# Altium footprint library WARG.PcbLib: 73 footprints (part 4 of 5)
Each footprint in its own frame and in the unit in brackets; x right, y up, seen from the top. Pads: shape width x height; smd on the part's side, far side on the other; paste and mask are expansions set on the pad; w line width, h text height; cw(c..) or ccw(c..) is an arc to the next point about the centre after c.
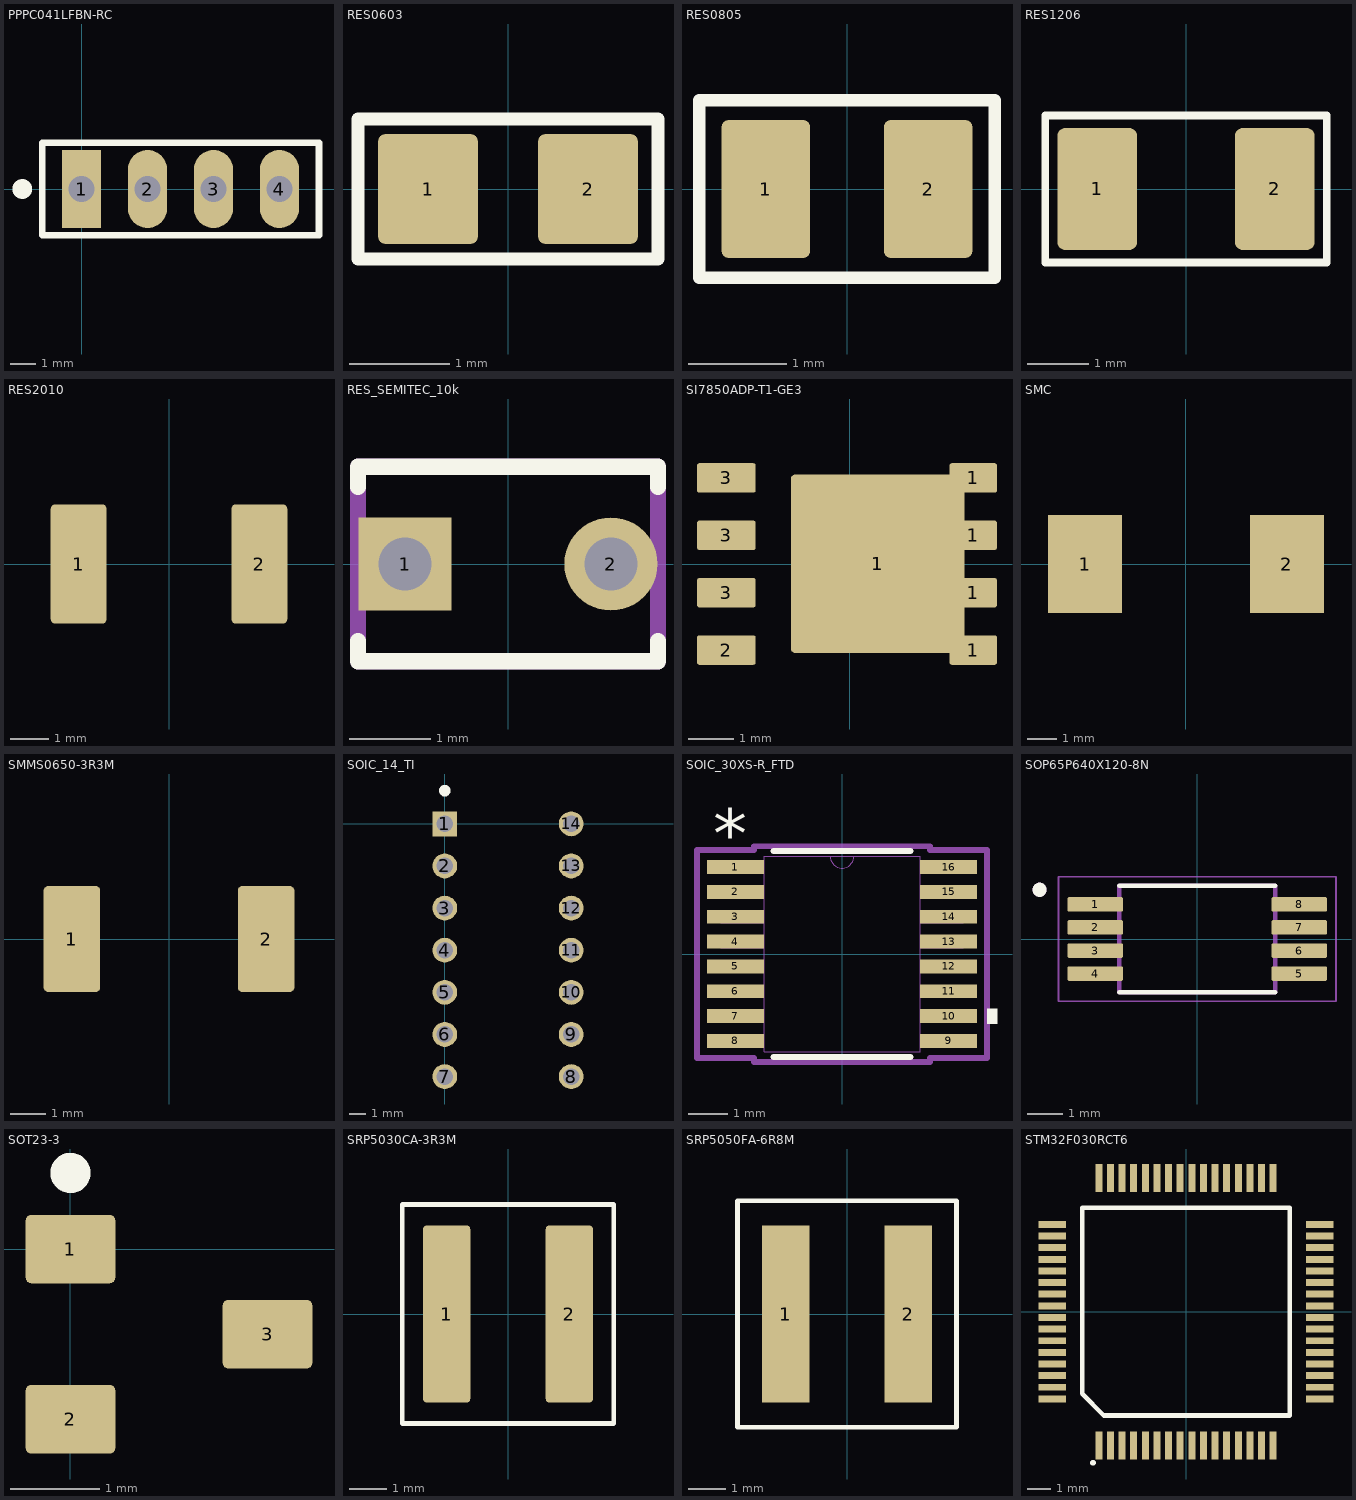
[diagram p3: the footprints below, top view; thin cyan lines are the x and y axes]

## PPPC041LFBN-RC [mm] "4 Pin Female Header"
pads (4):
  rect 1.508x3.016 hole 1: 1(0,0)
  oval 1.508x3.016 hole 1: 2(2.54,0) 3(5.08,0) 4(7.62,0)
Top Overlay:
  circle w0.508: c-2.286,0 r0.127
  lines w0.254: -1.524,-1.778 -1.524,1.778 9.144,1.778 9.144,-1.778 -1.524,-1.778
3D body "PPPC041LFBN-RC.stp": height 8.53, standoff -3.47, extent -1.52,-1.27 9.14,1.27

## RES0603 [mm] "SMT Resistor 0603"
height 0.6
pads (2):
  rrect15% 1x1.1 smd: 1(-0.8,0) 2(0.8,0)
Top Overlay:
  lines w0.127: -1.5,-0.7 -1.5,0.7 1.5,0.7 1.5,-0.7 -1.5,-0.7
3D body "0603.step": height 0.46, standoff 0.01, extent -0.8,-0.4 0.8,0.4

## RES0805 [mm] "SMT Resistor 0805"
height 0.5
pads (2):
  rrect15% 0.9x1.4 smd: 1(-0.825,0) 2(0.825,0)
Top Overlay:
  lines w0.127: -1.5,-0.9 -1.5,0.9 1.5,0.9 1.5,-0.9 -1.5,-0.9
3D body "0805 resistor.step": height 0.61, standoff 0.01, extent -1,-0.625 1,0.625

## RES1206 [mm] "SMT Resistor 1206"
height 0.75
pads (2):
  rrect20% 1.3x2 smd: 1(-1.45,0) 2(1.45,0)
Top Overlay:
  lines w0.127: -2.3,-1.2 2.3,-1.2 2.3,1.2 -2.3,1.2 -2.3,-1.2
3D body "1206 resistor.step": height 0.61, standoff 0.01, extent -1.6,-0.8 1.6,0.8

## RES2010 [mm]
pads (2):
  rrect15% 1.45x3.1 smd: 1(-2.35,0) 2(2.35,0)
3D body "PE2010FKE070R01L.STEP": height 0.9, standoff 0.01, extent -2.54,-1.27 2.54,1.27

## RES_SEMITEC_10k [mm]
pads (2):
  rect 1.15x1.15 hole 0.65 paste-1000 mask+0: 1(-1.27,0)
  round 1.15 hole 0.65 paste-1000 mask+0: 2(1.27,0)
Top Overlay:
  lines w0.2: -1.85,-0.95 -1.85,-1.2 1.85,-1.2 1.85,-0.95 ; -1.85,0.95 -1.85,1.2 1.85,1.2 1.85,0.95
Mechanical 12:
  lines w0.2: -1.85,-1.2 1.85,-1.2 1.85,1.2 -1.85,1.2 -1.85,-1.2
3D body "Res_Semitec_103AT-2_eec.STEP": height 0.25, standoff 0, extent -1.95,-1.3 1.95,1.3

## SI7850ADP-T1-GE3 [mm]
pads (9):
  rrect5% 3.85x3.95 smd: 1(0.618,0.005)
  rrect15% 1.05x0.65 smd: 1(2.733,-1.905) 1(2.733,-0.635) 1(2.733,0.635) 1(2.733,1.905)
  rrect15% 1.3x0.65 smd: 2(-2.732,-1.905) 3(-2.732,-0.635) 3(-2.732,0.635) 3(-2.732,1.905)

## SMC [mm]
pads (2):
  rect 2.5x3.3 smd: 1(-3.4,0) 2(3.4,0)
3D body "S3J-13-F.stp": height 2.5, standoff 0, extent -3.97,-2.953 3.97,2.953

## SMMS0650-3R3M [mm] "IND 3.3UH 8.5A 22M OHM"
pads (2):
  rrect15% 1.6x3 smd: 1(-2.75,0) 2(2.75,0)
3D body: height 5, standoff 0, extent -3.55,-3.3 3.55,3.3

## SOIC_14_TI [mil]
pads (14):
  rect 59x59 hole 39 mask+0: 1(0,0)
  round 59 hole 39 mask+0: 2(0,-100) 3(0,-200) 4(0,-300) 5(0,-400) 6(0,-500) 7(0,-600) 8(300,-600) 9(300,-500) 10(300,-400) 11(300,-300) 12(300,-200) 13(300,-100) 14(300,0)
Top Overlay:
  circle w19.68: c0,78.74 r3.94
3D body "PDIP14_300MC_MCH.step": height 215.12, standoff -100, extent -5,-687.48 315,87.48

## SOIC_30XS-R_FTD [mil]
pads (16):
  rect 57.5x14 smd paste+0 mask+0: 1(-107.25,87.5) 2(-107.25,62.5) 3(-107.25,37.5) 4(-107.25,12.5) 5(-107.25,-12.5) 6(-107.25,-37.5) 7(-107.25,-62.5) 8(-107.25,-87.5) 9(107.25,-87.5) 10(107.25,-62.5) 11(107.25,-37.5) 12(107.25,-12.5) 13(107.25,12.5) 14(107.25,37.5) 15(107.25,62.5) 16(107.25,87.5)
Top Overlay:
  region: 146,-55 156,-55 156,-70 146,-70
  lines w6: -68.98,-103.5 68.98,-103.5 ; -68.98,103.5 68.98,103.5
  text "*" at -129.75,96.5 h50
Mechanical 13:
  lines w0: -12,98.5 ccw(c0,98.5) 12,98.5
  lines w1: -122,-93.5 -78.5,-93.5 -78.5,-81.5 -122,-81.5 -122,-93.5 ; -122,-68.5 -78.5,-68.5 -78.5,-56.5 -122,-56.5 -122,-68.5 ; -122,-43.5 -78.5,-43.5 -78.5,-31.5 -122,-31.5 -122,-43.5 ; -122,-18.5 -78.5,-18.5 -78.5,-6.5 -122,-6.5 -122,-18.5 ; -122,6.5 -78.5,6.5 -78.5,18.5 -122,18.5 -122,6.5 ; -122,31.5 -78.5,31.5 -78.5,43.5 -122,43.5 -122,31.5 ; -122,56.5 -78.5,56.5 -78.5,68.5 -122,68.5 -122,56.5 ; -122,81.5 -78.5,81.5 -78.5,93.5 -122,93.5 -122,81.5 ; -78.5,-98.5 -78.5,98.5 78.5,98.5 78.5,-98.5 -78.5,-98.5 ; 78.5,-93.5 122,-93.5 122,-81.5 78.5,-81.5 78.5,-93.5 ; 78.5,-68.5 122,-68.5 122,-56.5 78.5,-56.5 78.5,-68.5 ; 78.5,-43.5 122,-43.5 122,-31.5 78.5,-31.5 78.5,-43.5 ; 78.5,-18.5 122,-18.5 122,-6.5 78.5,-6.5 78.5,-18.5 ; 78.5,6.5 122,6.5 122,18.5 78.5,18.5 78.5,6.5 ; 78.5,31.5 122,31.5 122,43.5 78.5,43.5 78.5,31.5 ; 78.5,56.5 122,56.5 122,68.5 78.5,68.5 78.5,56.5 ; 78.5,81.5 122,81.5 122,93.5 78.5,93.5 78.5,81.5
  text "*" at -76,45.5 h50
Mechanical 15:
  lines w6: -146,-104.5 -88.5,-104.5 -88.5,-108.5 88.5,-108.5 88.5,-104.5 146,-104.5 146,104.5 88.5,104.5 88.5,108.5 -88.5,108.5 -88.5,104.5 -146,104.5 -146,-104.5
3D body "SOIC_30XS-R_FTD.step": height 69.09, standoff 0, extent -122.01,-98.5 122.01,98.5

## SOP65P640X120-8N [mm]
pads (8):
  rrect25% 1.57x0.41 smd: 1(-2.87,0.975) 2(-2.87,0.325) 3(-2.87,-0.325) 4(-2.87,-0.975) 5(2.87,-0.975) 6(2.87,-0.325) 7(2.87,0.325) 8(2.87,0.975)
Top Overlay:
  circle w0.2: c-4.44,1.385 r0.1
  lines w0.127: -2.2,-1.5 2.2,-1.5 ; -2.2,1.5 2.2,1.5
Mechanical 13:
  circle w0.2: c-4.44,1.385 r0.1
  lines w0.127: -2.2,-1.5 2.2,-1.5 2.2,1.5 -2.2,1.5 -2.2,-1.5
Mechanical 15:
  lines w0.05: -3.905,-1.75 3.905,-1.75 3.905,1.75 -3.905,1.75 -3.905,-1.75
3D body "LM311PWR.STEP": height 1.2, standoff 0, extent -3.2,-1.5 3.2,1.5

## SOT23-3 [mm] "SOT23, 3-Leads, Body 2.90x2.30mm, Pitch 0.95mm, IPC Medium Density"
height 1.1
pads (3):
  rrect15% 1x0.764 smd: 1(0,0) 2(0,-1.9) 3(2.2,-0.95)
Top Overlay:
  circle w0.25: c0,0.85 r0.1
3D body "SOT95P230X110-3N.step": height 1.1, standoff 0, extent -0.15,-2.45 2.45,0.55

## SRP5030CA-3R3M [mm] "FIXED IND 3.3UH 8.1A 23.1MOHM SM"
pads (2):
  rrect15% 1.25x4.7 smd: 1(-1.625,0) 2(1.625,0)
Top Overlay:
  lines w0.127: -2.8,-2.9 -2.8,2.6 -2.8,2.9 2.8,2.9 2.8,-2.9 -2.8,-2.9
3D body "SRP5030CA.stp": height 2.95, standoff 0.01, extent -2.65,-2.75 2.65,2.75

## SRP5050FA-6R8M [mm]
pads (2):
  rect 1.25x4.7 smd: 1(-1.625,0) 2(1.625,0)
Top Overlay:
  lines w0.127: -2.9,-3 -1.25,-3 1.25,-3 2.9,-3 2.9,3 1.25,3 -1.25,3 -2.9,3 -2.9,-3
3D body "IND_SRP5050FA_BRN.step": height 5.01, standoff 0, extent -2.756,-2.858 2.756,2.858

## STM32F030RCT6 [mm]
pads (64):
  rect 0.3x1.2 smd: 1(-3.75,-5.75) 2(-3.25,-5.75) 3(-2.75,-5.75) 4(-2.25,-5.75) 5(-1.75,-5.75) 6(-1.25,-5.75) 7(-0.75,-5.75) 8(-0.25,-5.75) 9(0.25,-5.75) 10(0.75,-5.75) 11(1.25,-5.75) 12(1.75,-5.75) 13(2.25,-5.75) 14(2.75,-5.75) 15(3.25,-5.75) 16(3.75,-5.75) 33(3.75,5.75) 34(3.25,5.75) 35(2.75,5.75) 36(2.25,5.75) 37(1.75,5.75) 38(1.25,5.75) 39(0.75,5.75) 40(0.25,5.75) 41(-0.25,5.75) 42(-0.75,5.75) 43(-1.25,5.75) 44(-1.75,5.75) 45(-2.25,5.75) 46(-2.75,5.75) 47(-3.25,5.75) 48(-3.75,5.75)
  rect 1.2x0.3 smd: 17(5.75,-3.75) 18(5.75,-3.25) 19(5.75,-2.75) 20(5.75,-2.25) 21(5.75,-1.75) 22(5.75,-1.25) 23(5.75,-0.75) 24(5.75,-0.25) 25(5.75,0.25) 26(5.75,0.75) 27(5.75,1.25) 28(5.75,1.75) 29(5.75,2.25) 30(5.75,2.75) 31(5.75,3.25) 32(5.75,3.75) 49(-5.75,3.75) 50(-5.75,3.25) 51(-5.75,2.75) 52(-5.75,2.25) 53(-5.75,1.75) 54(-5.75,1.25) 55(-5.75,0.75) 56(-5.75,0.25) 57(-5.75,-0.25) 58(-5.75,-0.75) 59(-5.75,-1.25) 60(-5.75,-1.75) 61(-5.75,-2.25) 62(-5.75,-2.75) 63(-5.75,-3.25) 64(-5.75,-3.75)
Top Overlay:
  circle w0.15: c-4,-6.5 r0.05
  lines w0.2: -4.465,-3.535 -4.465,4.465 4.465,4.465 4.465,-4.465 -3.535,-4.465 -4.465,-3.535
3D body "LQFP64-10x10mm.step": height 1.6, standoff 0, extent -5.997,-5.997 5.997,5.997